# Altium footprint library My_PCB_6_28.PcbLib: 151 footprints (part 6 of 10)
Each footprint in its own frame and in the unit in brackets; x right, y up, seen from the top. Pads: shape width x height; smd on the part's side, far side on the other; paste and mask are expansions set on the pad; w line width, h text height; cw(c..) or ccw(c..) is an arc to the next point about the centre after c.
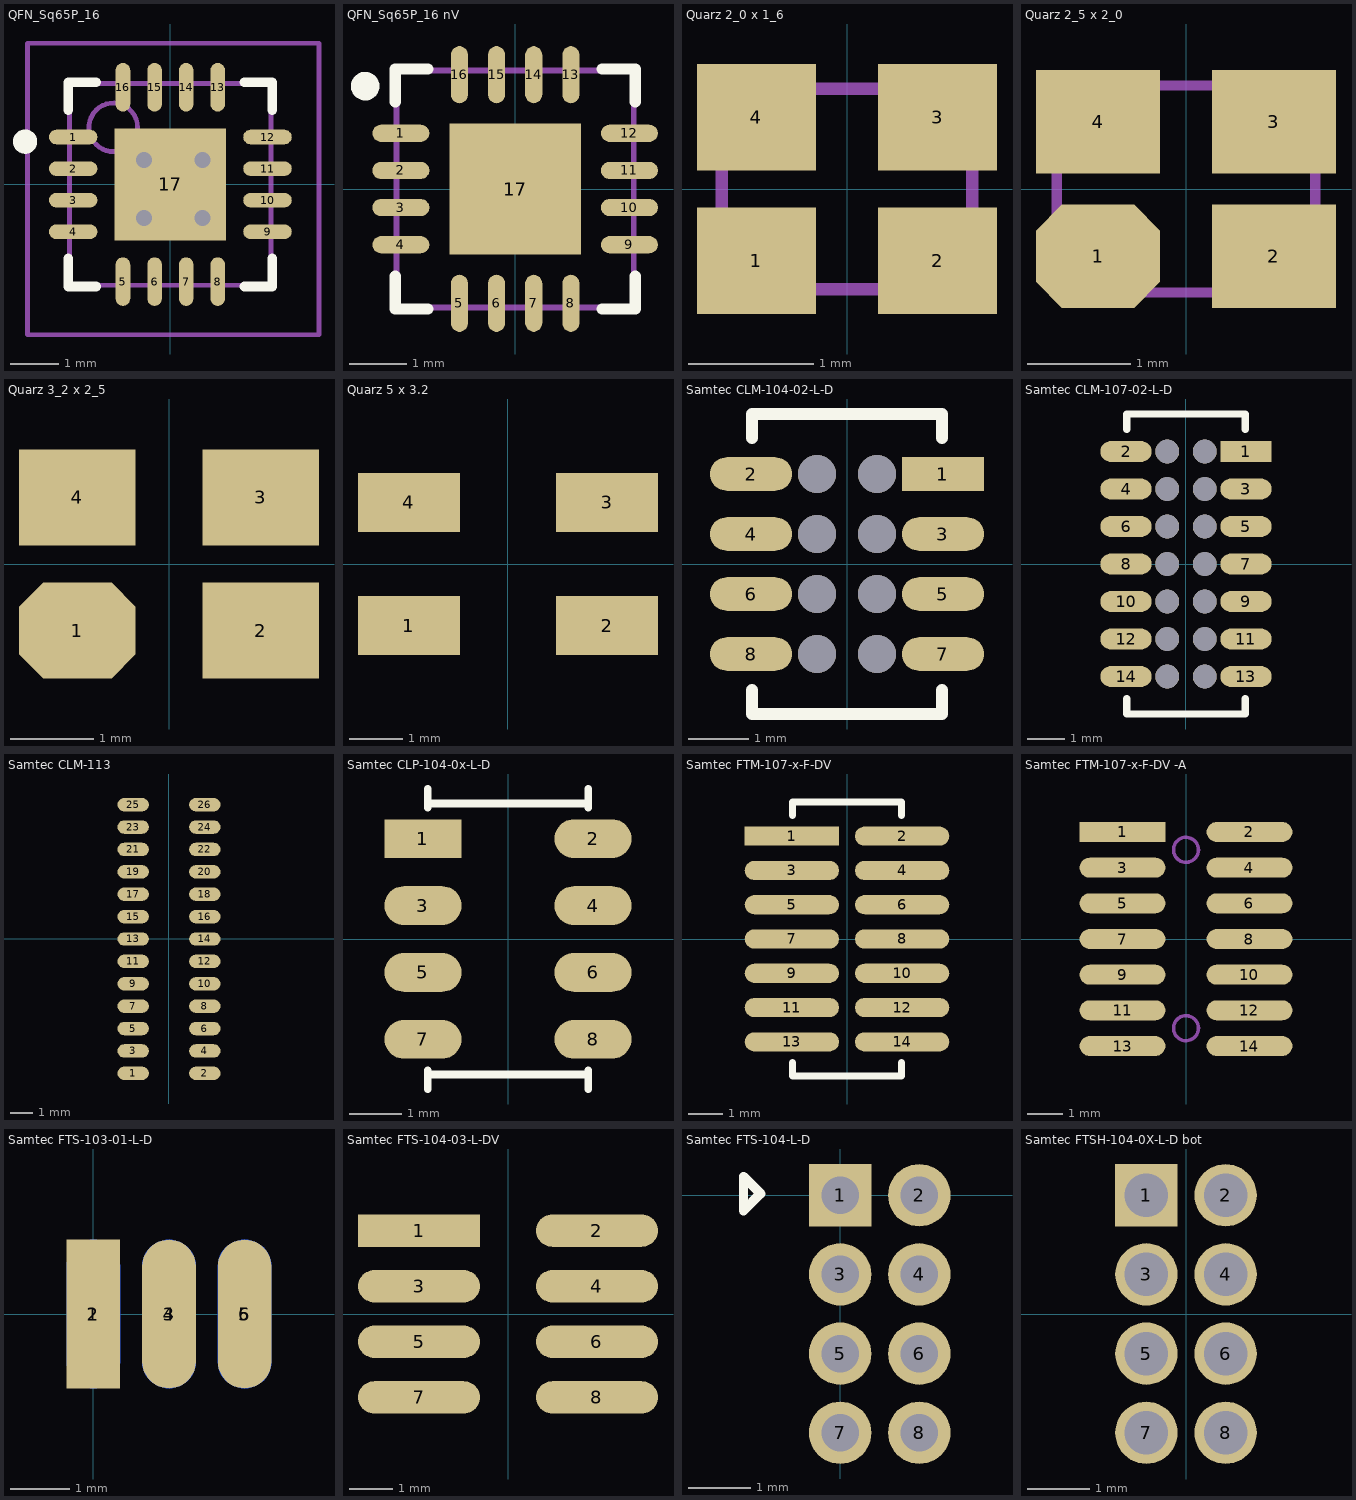
[diagram p5: the footprints below, top view; thin cyan lines are the x and y axes]

## QFN_Sq65P_16 [mm]
height 1
pads (17):
  oval 1x0.3 smd: 1(-2,0.975) 2(-2,0.325) 3(-2,-0.325) 4(-2,-0.975) 9(2,-0.975) 10(2,-0.325) 11(2,0.325) 12(2,0.975)
  oval 0.3x1 smd: 5(-0.975,-2) 6(-0.325,-2) 7(0.325,-2) 8(0.975,-2) 13(0.975,2) 14(0.325,2) 15(-0.325,2) 16(-0.975,2)
  rect 2.3x2.3 smd: 17(0,0)
via -0.54,0.505 diameter 0.66 hole 0.33
via 0.66,0.505 diameter 0.66 hole 0.33
via -0.54,-0.695 diameter 0.66 hole 0.33
via 0.66,-0.695 diameter 0.66 hole 0.33
Top Overlay:
  circle w0.25: c-2.99,0.88 r0.125
  lines w0.2: -2.1,-1.525 -2.1,-2.1 -1.525,-2.1 ; -2.1,1.525 -2.1,2.1 -1.525,2.1 ; 1.525,-2.1 2.1,-2.1 2.1,-1.525 ; 1.525,2.1 2.1,2.1 2.1,1.525
Mechanical 13:
  circle w0.1: c-1.175,1.175 r0.5
  lines w0.1: -2.075,-2.075 2.075,-2.075 2.075,2.075 -2.075,2.075 -2.075,-2.075
Mechanical 15:
  lines w0.1: -0.5,0 0.5,0 ; 0,-0.5 0,0.5 ; -2.94,-3.095 -2.94,2.905 3.06,2.905 3.06,-3.095 -2.94,-3.095
3D body: height 1, standoff 0, extent -2.075,-2.075 2.075,2.075

## QFN_Sq65P_16 nV [mm]
height 1
pads (17):
  oval 1x0.3 smd: 1(-2,0.975) 2(-2,0.325) 3(-2,-0.325) 4(-2,-0.975) 9(2,-0.975) 10(2,-0.325) 11(2,0.325) 12(2,0.975)
  oval 0.3x1 smd: 5(-0.975,-2) 6(-0.325,-2) 7(0.325,-2) 8(0.975,-2) 13(0.975,2) 14(0.325,2) 15(-0.325,2) 16(-0.975,2)
  rect 2.3x2.3 smd: 17(0,0)
Top Overlay:
  circle w0.25: c-2.625,1.8 r0.125
  lines w0.2: -2.1,-1.525 -2.1,-2.1 -1.525,-2.1 ; -2.1,1.525 -2.1,2.1 -1.525,2.1 ; 1.525,-2.1 2.1,-2.1 2.1,-1.525 ; 1.525,2.1 2.1,2.1 2.1,1.525
Mechanical 3:
  lines w0.1: -2.075,-2.075 2.075,-2.075 2.075,2.075 -2.075,2.075 -2.075,-2.075
Mechanical 15:
  lines w0.1: -0.5,0 0.5,0 ; 0,-0.5 0,0.5
3D body: height 1, standoff 0, extent -2.075,-2.075 2.075,2.075

## Quarz 2_0 x 1_6 [mm] "Q22FA1280xxxx00"
height 0.5
pads (4):
  rect 0.95x0.85 smd: 1(-0.725,-0.575) 2(0.725,-0.575) 3(0.725,0.575) 4(-0.725,0.575)
Mechanical 3:
  lines w0.1: -1,-0.8 -1,0.8 1,0.8 1,-0.8 -1,-0.8
3D body: height 0.5, standoff 0, extent -1,-0.8 1,0.8

## Quarz 2_5 x 2_0 [mm] "CX2520SB Kyocera"
height 0.45
pads (4):
  oct 1.2x1 smd: 1(-0.85,-0.65)
  rect 1.2x1 smd: 2(0.85,-0.65) 3(0.85,0.65) 4(-0.85,0.65)
Mechanical 3:
  lines w0.1: -1.25,-1 -1.25,1 1.25,1 1.25,-1 -1.25,-1
3D body: height 0.65, standoff 0.02, extent -1.25,-1 1.25,1

## Quarz 3_2 x 2_5 [mm]
pads (4):
  oct 1.4x1.15 smd: 1(-1.1,-0.8)
  rect 1.4x1.15 smd: 2(1.1,-0.8) 3(1.1,0.8) 4(-1.1,0.8)
3D body: height 0.81, standoff 0, extent -1.607,-1.25 1.607,1.25

## Quarz 5 x 3.2 [mm]
pads (4):
  rect 1.9x1.1 smd: 1(-1.85,-1.15) 2(1.85,-1.15) 3(1.85,1.15) 4(-1.85,1.15)
3D body: height 1.11, standoff 0.1, extent -2.48,-1.61 2.52,1.59

## Samtec CLM-104-02-L-D [mm]
pads (16):
  rect 1.37x0.56 smd: 1(1.6,1.5)
  oval 1.37x0.56 smd: 2(-1.6,1.5) 3(1.6,0.5) 4(-1.6,0.5) 5(1.6,-0.5) 6(-1.6,-0.5) 7(1.6,-1.5) 8(-1.6,-1.5)
  round 0.635 hole 0.635: ""(-0.5,-1.5) ""(-0.5,-0.5) ""(-0.5,0.5) ""(-0.5,1.5) ""(0.5,-1.5) ""(0.5,-0.5) ""(0.5,1.5) ""(0.5,0.5)
Top Overlay:
  lines w0.2: -1.585,-2.1 -1.585,-2.5 1.585,-2.5 1.585,-2.1 ; -1.585,2.1 -1.585,2.5 1.585,2.5 1.585,2.1
3D body: height 2.3, standoff 0.05, extent -1.905,-2.159 1.905,2.159

## Samtec CLM-107-02-L-D [mm]
pads (28):
  rect 1.37x0.56 smd: 1(1.6,3)
  oval 1.37x0.56 smd: 2(-1.6,3) 3(1.6,2) 4(-1.6,2) 5(1.6,1) 6(-1.6,1) 7(1.6,0) 8(-1.6,0) 9(1.6,-1) 10(-1.6,-1) 11(1.6,-2) 12(-1.6,-2) 13(1.6,-3) 14(-1.6,-3)
  round 0.635 hole 0.635: ""(-0.5,-3) ""(-0.5,-2) ""(-0.5,-1) ""(-0.5,0) ""(-0.5,1) ""(-0.5,2) ""(-0.5,3) ""(0.5,-3) ""(0.5,-2) ""(0.5,-1) ""(0.5,0) ""(0.5,1) ""(0.5,3) ""(0.5,2)
Top Overlay:
  lines w0.2: -1.585,-3.6 -1.585,-4 1.585,-4 1.585,-3.6 ; -1.585,3.6 -1.585,4 1.585,4 1.585,3.6

## Samtec CLM-113 [mm]
pads (26):
  oval 1.4x0.6 smd: 1(-1.6,-6) 2(1.6,-6) 3(-1.6,-5) 4(1.6,-5) 5(-1.6,-4) 6(1.6,-4) 7(-1.6,-3) 8(1.6,-3) 9(-1.6,-2) 10(1.6,-2) 11(-1.6,-1) 12(1.6,-1) 13(-1.6,0) 14(1.6,0) 15(-1.6,1) 16(1.6,1) 17(-1.6,2) 18(1.6,2) 19(-1.6,3) 20(1.6,3) 21(-1.6,4) 22(1.6,4) 23(-1.6,5) 24(1.6,5) 25(-1.6,6) 26(1.6,6)

## Samtec CLP-104-0x-L-D [mm]
pads (8):
  rect 1.47x0.74 smd: 1(-1.615,1.905)
  oval 1.47x0.74 smd: 2(1.615,1.905) 3(-1.615,0.635) 4(1.615,0.635) 5(-1.615,-0.635) 6(1.615,-0.635) 7(-1.615,-1.905) 8(1.615,-1.905)
Top Overlay:
  lines w0.15: -1.525,-2.85 -1.525,-2.5 ; -1.525,-2.575 1.525,-2.575 ; -1.525,2.5 -1.525,2.85 ; -1.525,2.575 1.525,2.575 ; 1.525,-2.85 1.525,-2.5 ; 1.525,2.5 1.525,2.85
3D body: height 2.27, standoff 0.02, extent -2.159,-2.756 2.159,2.756

## Samtec FTM-107-x-F-DV [mm]
pads (14):
  rect 2.75x0.56 smd: 1(-1.607,3)
  oval 2.75x0.56 smd: 2(1.607,3) 3(-1.607,2) 4(1.607,2) 5(-1.607,1) 6(1.607,1) 7(-1.607,0) 8(1.607,0) 9(-1.607,-1) 10(1.607,-1) 11(-1.607,-2) 12(1.607,-2) 13(-1.607,-3) 14(1.607,-3)
Top Overlay:
  lines w0.2: -1.585,-3.6 -1.585,-4 1.585,-4 1.585,-3.6 ; -1.585,3.6 -1.585,4 1.585,4 1.585,3.6

## Samtec FTM-107-x-F-DV -A [mm]
pads (14):
  rect 2.41x0.56 smd: 1(-1.78,3)
  oval 2.41x0.56 smd: 2(1.78,3) 3(-1.78,2) 4(1.78,2) 5(-1.78,1) 6(1.78,1) 7(-1.78,0) 8(1.78,0) 9(-1.78,-1) 10(1.78,-1) 11(-1.78,-2) 12(1.78,-2) 13(-1.78,-3) 14(1.78,-3)
Mechanical 3:
  circle w0.1: c0,-2.5 r0.35
  circle w0.1: c0,2.5 r0.35

## Samtec FTS-103-01-L-D [mm]
pads (6):
  rect 0.9x2.5 smd: 1(0,0)
  oval 0.9x2.5 smd far side: 2(0,0) 4(1.27,0) 6(2.54,0)
  oval 0.9x2.5 smd: 3(1.27,0) 5(2.54,0)
3D body: height 1.26, standoff -2.16, extent -0.655,-5.212 3.155,0.986

## Samtec FTS-104-03-L-DV [mm]
pads (8):
  rect 2.79x0.74 smd: 1(-2.035,1.905)
  oval 2.79x0.74 smd: 2(2.035,1.905) 3(-2.035,0.635) 4(2.035,0.635) 5(-2.035,-0.635) 6(2.035,-0.635) 7(-2.035,-1.905) 8(2.035,-1.905)
3D body: height 2.91, standoff -0.01, extent -2.921,-2.54 2.921,2.54

## Samtec FTS-104-L-D [mm]
pads (8):
  rect 1x1 hole 0.6: 1(0,0)
  round 1 hole 0.6: 2(1.27,0) 3(0,-1.27) 4(1.27,-1.27) 5(0,-2.54) 6(1.27,-2.54) 7(0,-3.81) 8(1.27,-3.81)
Top Overlay:
  lines w0.15: -1.55,-0.25 -1.275,0.025 -1.55,0.3 -1.55,-0.25
3D body: height 3.91, standoff -2.29, extent -1.064,-4.44 2.365,0.64

## Samtec FTSH-104-0X-L-D bot [mm]
pads (8):
  rect 1x1 hole 0.7: 1(-0.635,1.905)
  round 1 hole 0.7: 2(0.635,1.905) 3(-0.635,0.635) 4(0.635,0.635) 5(-0.635,-0.635) 6(0.635,-0.635) 7(-0.635,-1.905) 8(0.635,-1.905)
3D body: height 5.61, standoff -2.24, extent -1.714,-2.54 1.715,2.54